# Altium footprint library CONN_FPC.PcbLib: 28 footprints (part 1 of 2)
Each footprint in its own frame and in the unit in brackets; x right, y up, seen from the top. Pads: shape width x height; smd on the part's side, far side on the other; paste and mask are expansions set on the pad; w line width, h text height; cw(c..) or ccw(c..) is an arc to the next point about the centre after c.
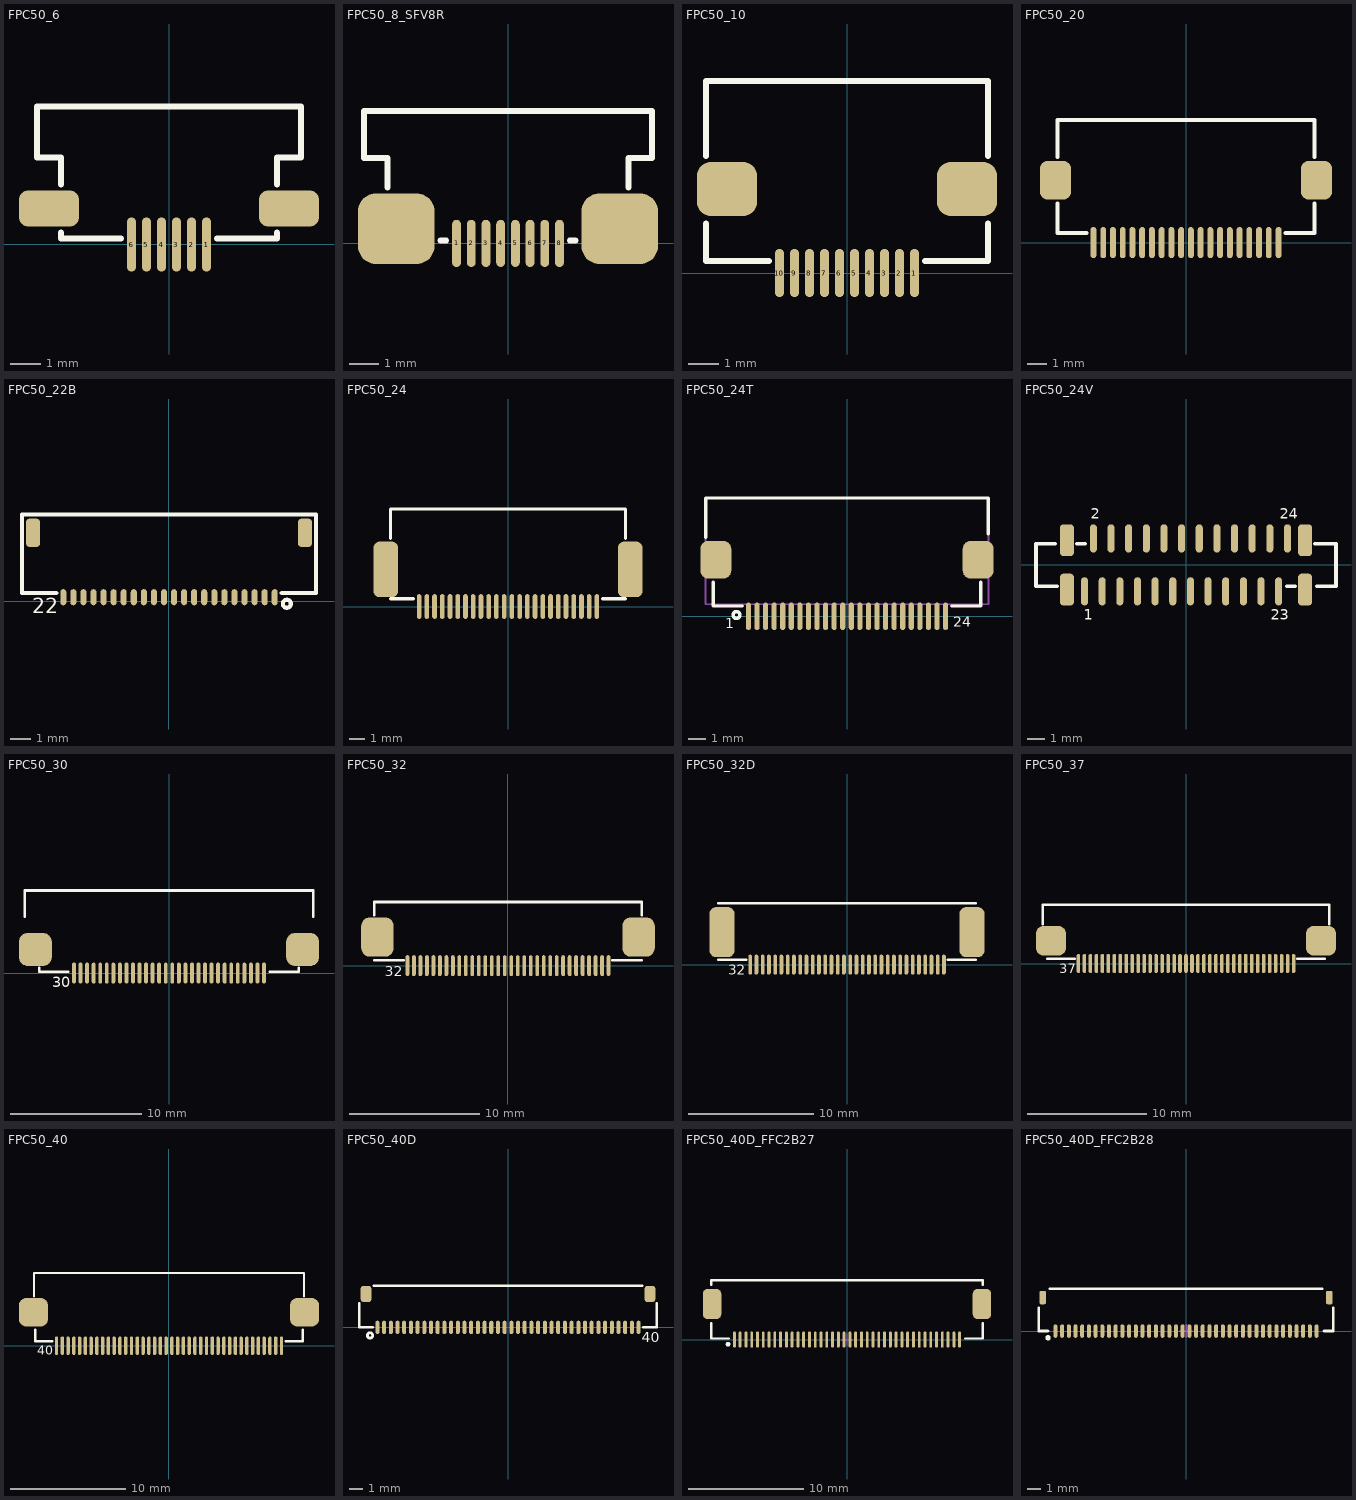
[diagram p0: the footprints below, top view; thin cyan lines are the x and y axes]

## FPC50_6 [mm] "FFC-FPC 6pin pitch: 0.5mm FCI SFV6R1STBE1HLF"
height 3
pads (8):
  oval 0.3x1.8 smd mask+0.075: 1(1.25,0) 2(0.75,0) 3(0.25,0) 4(-0.25,0) 5(-0.75,0) 6(-1.25,0)
  rrect50% 2x1.2 smd: ""(-4,1.2) ""(4,1.2)
Top Overlay:
  lines w0.2: -3.6,0.4 -3.6,0.2 -1.6,0.2 ; -3.6,2 -3.6,2.9 -4.4,2.9 -4.4,4.6 4.4,4.6 4.4,2.9 3.6,2.9 3.6,2 ; 1.6,0.2 3.6,0.2 3.6,0.4
3D body "sfv6r1stbe1hlf.stp": height 1.9, standoff 0.03, extent -4.25,-0.4 4.25,4.5

## FPC50_8_SFV8R [mm] "FPC 8pin pitch: 0.5mm FCI SFV8R-2STE1HLF"
pads (10):
  oval 0.3x1.6 smd mask+0.05: 1(-1.75,0) 2(-1.25,0) 3(-0.75,0) 4(-0.25,0) 5(0.25,0) 6(0.75,0) 7(1.25,0) 8(1.75,0)
  rrect50% 2.6x2.4 smd: ""(-3.8,0.5) ""(3.8,0.5)
Top Overlay:
  lines w0.2: -4.1,1.9 -4.1,2.9 -4.9,2.9 -4.9,4.5 4.9,4.5 4.9,2.9 4.1,2.9 4.1,1.9 ; -2.3,0.1 -2.1,0.1 ; 2.1,0.1 2.3,0.1
3D body "ssfv8r_2stlf.stp": height 1.82, standoff -0.05, extent -4.75,-0.5 4.75,4.4

## FPC50_10 [mm] "FPC, 0.50mm, SMT,RA Bot. Contact, WE 687110149022"
height 7.62
pads (12):
  oval 0.3x1.6 smd mask+0.05: 1(2.25,0) 2(1.75,0) 3(1.25,0) 4(0.75,0) 5(0.25,0) 6(-0.25,0) 7(-0.75,0) 8(-1.25,0) 9(-1.75,0) 10(-2.25,0)
  rrect50% 2x1.8 smd: ""(-4,2.8) ""(4,2.8)
Top Overlay:
  lines w0.2: -4.7,1.65 -4.7,0.4 -2.6,0.4 ; -4.7,3.9 -4.7,6.4 4.7,6.4 4.7,3.9 ; 2.6,0.4 4.7,0.4 4.7,1.65
3D body "687110149022.stp": height 2.25, standoff 0, extent -4.55,-0.225 4.55,6.275

## FPC50_20 [mm] "FH12-20S-0.5SH FFC-FPC pitch: 0.5mm"
height 3
pads (22):
  oval 0.3x1.6 smd mask+0.05: 1(4.75,0) 2(4.25,0) 3(3.75,0) 4(3.25,0) 5(2.75,0) 6(2.25,0) 7(1.75,0) 8(1.25,0) 9(0.75,0) 10(0.25,0) 11(-0.25,0) 12(-0.75,0) 13(-1.25,0) 14(-1.75,0) 15(-2.25,0) 16(-2.75,0) 17(-3.25,0) 18(-3.75,0) 19(-4.25,0) 20(-4.75,0)
  rrect50% 1.6x2 smd: ""(-6.7,3.2) ""(6.7,3.2)
Top Overlay:
  lines w0.2: -6.6,2 -6.6,0.5 -5.1,0.5 ; -6.6,4.4 -6.6,6.3 6.6,6.3 6.6,4.4 ; 5.1,0.5 6.6,0.5 6.6,2
3D body "FH12-20S-0.5SH.stp": height 2.14, standoff 0.04, extent -7.05,-0.2 7.05,6.2

## FPC50_22B [mm] "Connector; FH12 Series; 24 Position; 0.5mm, Top Contact, FH12A-24S-0.5SH(55)"
height 2
pads (24):
  oval 0.3x0.8 smd mask+0.05: 1(5.25,0.2) 2(4.75,0.2) 3(4.25,0.2) 4(3.75,0.2) 5(3.25,0.2) 6(2.75,0.2) 7(2.25,0.2) 8(1.75,0.2) 9(1.25,0.2) 10(0.75,0.2) 11(0.25,0.2) 12(-0.25,0.2) 13(-0.75,0.2) 14(-1.25,0.2) 15(-1.75,0.2) 16(-2.25,0.2) 17(-2.75,0.2) 18(-3.25,0.2) 19(-3.75,0.2) 20(-4.25,0.2) 21(-4.75,0.2) 22(-5.25,0.2)
  rrect50% 0.7x1.4 smd: ""(-6.75,3.4) ""(6.75,3.4)
Top Overlay:
  circle w0.2: c5.85,-0.125 r0.2
  lines w0.2: -5.6,0.4 -7.3,0.4 -7.3,4.3 7.3,4.3 7.3,0.4 5.6,0.4
  text "22" at -6.8,-0.6 h0.75
3D body "FH55-22S-0.5SH.stp": height 1.46, standoff -0.04, extent -7.2,0 7.2,4.25

## FPC50_24 [mm] "FPC, FH12 Series; 24 Position; 0.5mm, Bottom Contact, FH12F-24S-0.5SH"
pads (26):
  oval 0.3x1.6 smd mask+0.05: 1(5.75,0) 2(5.25,0) 3(4.75,0) 4(4.25,0) 5(3.75,0) 6(3.25,0) 7(2.75,0) 8(2.25,0) 9(1.75,0) 10(1.25,0) 11(0.75,0) 12(0.25,0) 13(-0.25,0) 14(-0.75,0) 15(-1.25,0) 16(-1.75,0) 17(-2.25,0) 18(-2.75,0) 19(-3.25,0) 20(-3.75,0) 21(-4.25,0) 22(-4.75,0) 23(-5.25,0) 24(-5.75,0)
  rrect50% 1.6x3.6 smd: ""(-7.9,2.4) ""(7.9,2.4)
Top Overlay:
  lines w0.2: -7.6,0.5 -6.1,0.5 ; -7.6,4.4 -7.6,6.3 7.6,6.3 7.6,4.4 ; 6.1,0.5 7.6,0.5
3D body "FH12F-24S-0.5SH.stp": height 2.04, standoff -0.06, extent -8.05,-0.2 8.05,6.2

## FPC50_24T [mm] "Connector; FH12 Series; 24 Position; 0.5mm, Top Contact, FH12A-24S-0.5SH(55)"
height 2
pads (26):
  oval 0.3x1.6 smd mask+0.05: 1(-5.75,0) 2(-5.25,0) 3(-4.75,0) 4(-4.25,0) 5(-3.75,0) 6(-3.25,0) 7(-2.75,0) 8(-2.25,0) 9(-1.75,0) 10(-1.25,0) 11(-0.75,0) 12(-0.25,0) 13(0.25,0) 14(0.75,0) 15(1.25,0) 16(1.75,0) 17(2.25,0) 18(2.75,0) 19(3.25,0) 20(3.75,0) 21(4.25,0) 22(4.75,0) 23(5.25,0) 24(5.75,0)
  rrect50% 1.8x2.2 smd: ""(-7.65,3.3) ""(7.65,3.3)
Top Overlay:
  circle w0.2: c-6.45,0.075 r0.2
  lines w0.2: -8.25,4.6 -8.25,6.9 8.25,6.9 8.25,4.825 ; -7.8,2 -7.8,0.6 -6.1,0.6 ; 6.1,0.6 7.8,0.6 7.8,2
  text "24" at 6.2,-0.6 h0.6
  text "1" at -7.1,-0.7 h0.6
Mechanical 13:
  lines w0.1: -8.25,0.7 -8.25,6.9 8.25,6.9 8.25,0.7 -8.25,0.7
3D body "FH12A-24S-0.5SH.stp": height 2.05, standoff -0.1, extent -8.25,-0.2 8.25,6.8

## FPC50_24V [mm] "Connector; FH12 Series; 24 Position; 0.5mm, Vertical, FH12-24S-0.5SV"
height 4.85
pads (28):
  oval 0.4x1.6 smd: 1(-5.75,-1.5) 2(-5.25,1.5) 3(-4.75,-1.5) 4(-4.25,1.5) 5(-3.75,-1.5) 6(-3.25,1.5) 7(-2.75,-1.5) 8(-2.25,1.5) 9(-1.75,-1.5) 10(-1.25,1.5) 11(-0.75,-1.5) 12(-0.25,1.5) 13(0.25,-1.5) 14(0.75,1.5) 15(1.25,-1.5) 16(1.75,1.5) 17(2.25,-1.5) 18(2.75,1.5) 19(3.25,-1.5) 20(3.75,1.5) 21(4.25,-1.5) 22(4.75,1.5) 23(5.25,-1.5) 24(5.75,1.5)
  rrect50% 0.8x1.8 smd: ""(-6.75,-1.4) ""(-6.75,1.4) ""(6.75,-1.4) ""(6.75,1.4)
Top Overlay:
  lines w0.2: -7.4,1.2 -8.5,1.2 -8.5,-1.2 -7.3,-1.2 ; -6.2,1.2 -5.7,1.2 ; 5.7,-1.2 6.2,-1.2 ; 7.3,1.2 8.5,1.2 8.5,-1.2 7.4,-1.2
  text "23" at 4.8,-3.1 h0.6
  text "24" at 5.3,2.6 h0.6
  text "2" at -5.4,2.6 h0.6
  text "1" at -5.8,-3.1 h0.6
3D body "FH12-24S-0.5SV.stp": height 5.48, standoff -0.03, extent -7.7,-1.8 7.7,2

## FPC50_30 [mm] "FPC, pitch: 0.5mm, FPC0.5MM4.6H30P-H"
height 3
pads (33):
  oval 0.3x1.6 smd mask+0.05: 1(7.25,0) 2(6.75,0) 3(6.25,0) 4(5.75,0) 5(5.25,0) 6(4.75,0) 7(4.25,0) 8(3.75,0) 9(3.25,0) 10(2.75,0) 11(2.25,0) 12(1.75,0) 13(1.25,0) 14(0.75,0) 15(0.25,0) 16(-0.25,0) 17(-0.75,0) 18(-1.25,0) 19(-1.75,0) 20(-2.25,0) 21(-2.75,0) 22(-3.25,0) 23(-3.75,0) 24(-4.25,0) 25(-4.75,0) 26(-5.25,0) 27(-5.75,0) 28(-6.25,0) 29(-6.75,0) 30(-7.25,0)
  rrect50% 2.5x2.5 smd: ""(-10.2,1.8) ""(-10.2,1.8) ""(10.2,1.8)
Top Overlay:
  lines w0.2: -11,4.3 -11,6.3 11,6.3 11,4.3 ; -9.9,0.4 -9.9,0.1 -7.7,0.1 ; 7.7,0.1 9.9,0.1 9.9,0.4
  text "30" at -8.9,-1.1 h0.8
3D body "FPC0_5MM4_6H30P-H.step": height 2.1, standoff 0.05, extent -10.8,-0.5 10.8,6.1

## FPC50_32 [mm] "FPC, FH12 Series; 32 Position; 0.5mm, Bottom Contact,"
height 3
pads (34):
  oval 0.3x1.6 smd mask+0.05: 1(7.75,0) 2(7.25,0) 3(6.75,0) 4(6.25,0) 5(5.75,0) 6(5.25,0) 7(4.75,0) 8(4.25,0) 9(3.75,0) 10(3.25,0) 11(2.75,0) 12(2.25,0) 13(1.75,0) 14(1.25,0) 15(0.75,0) 16(0.25,0) 17(-0.25,0) 18(-0.75,0) 19(-1.25,0) 20(-1.75,0) 21(-2.25,0) 22(-2.75,0) 23(-3.25,0) 24(-3.75,0) 25(-4.25,0) 26(-4.75,0) 27(-5.25,0) 28(-5.75,0) 29(-6.25,0) 30(-6.75,0) 31(-7.25,0) 32(-7.75,0)
  rrect50% 2.5x3 smd: ""(-10.05,2.2) ""(10.05,2.2)
Top Overlay:
  lines w0.2: -10.3,0.4 -8.05,0.4 ; -10.3,3.9 -10.3,4.9 10.3,4.9 10.3,3.9 ; 8.05,0.4 10.3,0.4
  text "32" at -9.5,-0.8 h0.8
3D body "FFC2B35-32-T.stp": height 1.99, standoff -0.01, extent -10.2,-0.3 10.2,6.46

## FPC50_32D [mm] "FPC, 32 Position; 0.5mm, Dual Side Contact,"
height 3
pads (34):
  oval 0.3x1.6 smd mask+0.05: 1(7.75,0) 2(7.25,0) 3(6.75,0) 4(6.25,0) 5(5.75,0) 6(5.25,0) 7(4.75,0) 8(4.25,0) 9(3.75,0) 10(3.25,0) 11(2.75,0) 12(2.25,0) 13(1.75,0) 14(1.25,0) 15(0.75,0) 16(0.25,0) 17(-0.25,0) 18(-0.75,0) 19(-1.25,0) 20(-1.75,0) 21(-2.25,0) 22(-2.75,0) 23(-3.25,0) 24(-3.75,0) 25(-4.25,0) 26(-4.75,0) 27(-5.25,0) 28(-5.75,0) 29(-6.25,0) 30(-6.75,0) 31(-7.25,0) 32(-7.75,0)
  rrect50% 2x4 smd: ""(-10,2.6) ""(10,2.6)
Top Overlay:
  lines w0.2: -10.3,0.4 -8.05,0.4 ; -10.3,4.9 10.3,4.9 ; 8.05,0.4 10.3,0.4
  text "32" at -9.5,-0.8 h0.8
3D body "XF2M_3215_1A.step": height 2, standoff 0, extent -10.05,-1.035 10.05,4.865

## FPC50_37 [mm] "FPC, pitch: 0.5mm, TE 3-1734592-7"
height 3
pads (39):
  oval 0.3x1.6 smd mask+0.05: 1(9,0) 2(8.5,0) 3(8,0) 4(7.5,0) 5(7,0) 6(6.5,0) 7(6,0) 8(5.5,0) 9(5,0) 10(4.5,0) 11(4,0) 12(3.5,0) 13(3,0) 14(2.5,0) 15(2,0) 16(1.5,0) 17(1,0) 18(0.5,0) 19(0,0) 20(-0.5,0) 21(-1,0) 22(-1.5,0) 23(-2,0) 24(-2.5,0) 25(-3,0) 26(-3.5,0) 27(-4,0) 28(-4.5,0) 29(-5,0) 30(-5.5,0) 31(-6,0) 32(-6.5,0) 33(-7,0) 34(-7.5,0) 35(-8,0) 36(-8.5,0) 37(-9,0)
  rrect50% 2.5x2.5 smd: ""(-11.3,1.9) ""(11.3,1.9)
Top Overlay:
  lines w0.2: -12,3.3 -12,4.9 12,4.9 12,3.3 ; -11.6,0.4 -9.3,0.4 ; 9.3,0.4 11.6,0.4
  text "37" at -10.6,-0.8 h0.8
3D body "3-1734592-7.stp": height 2.05, standoff 0, extent -11.965,-0.3 11.965,4.81

## FPC50_40 [mm] "FPC, pitch: 0.5mm, FH12-40S-0.5SH, molex 54132-4062"
height 3
pads (42):
  oval 0.3x1.6 smd mask+0.05: 1(9.75,0) 2(9.25,0) 3(8.75,0) 4(8.25,0) 5(7.75,0) 6(7.25,0) 7(6.75,0) 8(6.25,0) 9(5.75,0) 10(5.25,0) 11(4.75,0) 12(4.25,0) 13(3.75,0) 14(3.25,0) 15(2.75,0) 16(2.25,0) 17(1.75,0) 18(1.25,0) 19(0.75,0) 20(0.25,0) 21(-0.25,0) 22(-0.75,0) 23(-1.25,0) 24(-1.75,0) 25(-2.25,0) 26(-2.75,0) 27(-3.25,0) 28(-3.75,0) 29(-4.25,0) 30(-4.75,0) 31(-5.25,0) 32(-5.75,0) 33(-6.25,0) 34(-6.75,0) 35(-7.25,0) 36(-7.75,0) 37(-8.25,0) 38(-8.75,0) 39(-9.25,0) 40(-9.75,0)
  rrect50% 2.5x2.5 smd: ""(-11.75,2.9) ""(11.75,2.9)
Top Overlay:
  lines w0.2: -11.7,4.3 -11.7,6.3 11.7,6.3 11.7,4.3 ; -11.6,1.4 -11.6,0.4 -10.1,0.4 ; 10.1,0.4 11.6,0.4 11.6,1.4
  text "40" at -11.4,-0.8 h0.8
3D body "FH12-40S-0.5SH.stp": height 2.09, standoff -0.01, extent -12.05,-0.3 12.05,6.1

## FPC50_40D [mm] "FPC, 40 Position; 0.5mm, Top&Bottom Contact, FH34SRJ-40S-0.5SH"
height 2
pads (42):
  oval 0.3x1 smd paste-0.025 mask+0.05: 1(-9.75,0) 2(-9.25,0) 3(-8.75,0) 4(-8.25,0) 5(-7.75,0) 6(-7.25,0) 7(-6.75,0) 8(-6.25,0) 9(-5.75,0) 10(-5.25,0) 11(-4.75,0) 12(-4.25,0) 13(-3.75,0) 14(-3.25,0) 15(-2.75,0) 16(-2.25,0) 17(-1.75,0) 18(-1.25,0) 19(-0.75,0) 20(-0.25,0) 21(0.25,0) 22(0.75,0) 23(1.25,0) 24(1.75,0) 25(2.25,0) 26(2.75,0) 27(3.25,0) 28(3.75,0) 29(4.25,0) 30(4.75,0) 31(5.25,0) 32(5.75,0) 33(6.25,0) 34(6.75,0) 35(7.25,0) 36(7.75,0) 37(8.25,0) 38(8.75,0) 39(9.25,0) 40(9.75,0)
  rrect50% 0.8x1.2 smd paste-0.05 mask+0.05: ""(-10.6,2.5) ""(10.6,2.5)
Top Overlay:
  circle w0.2: c-10.3,-0.6 r0.2
  lines w0.2: -11.1,1.8 -11.1,0 -10.1,0 ; -10,3.1 10,3.1 ; 10.1,0 11.1,0 11.1,1.8
  text "40" at 10,-1.1 h0.75
3D body "FH34SRJ-40S-0.5SH.stp": height 1, standoff 0, extent -11,-0.8 11,3

## FPC50_40D_FFC2B27 [mm] "FPC, 40 Position; 0.5mm, Top&Bottom Contact, GCT FFC2B27-40-G"
pads (42):
  oval 0.25x1.4 smd mask+0.05: 1(-9.75,0) 2(-9.25,0) 3(-8.75,0) 4(-8.25,0) 5(-7.75,0) 6(-7.25,0) 7(-6.75,0) 8(-6.25,0) 9(-5.75,0) 10(-5.25,0) 11(-4.75,0) 12(-4.25,0) 13(-3.75,0) 14(-3.25,0) 15(-2.75,0) 16(-2.25,0) 17(-1.75,0) 18(-1.25,0) 19(-0.75,0) 20(-0.25,0) 21(0.25,0) 22(0.75,0) 23(1.25,0) 24(1.75,0) 25(2.25,0) 26(2.75,0) 27(3.25,0) 28(3.75,0) 29(4.25,0) 30(4.75,0) 31(5.25,0) 32(5.75,0) 33(6.25,0) 34(6.75,0) 35(7.25,0) 36(7.75,0) 37(8.25,0) 38(8.75,0) 39(9.25,0) 40(9.75,0)
  rrect50% 1.6x2.6 smd: ""(-11.685,3.08) ""(11.685,3.08)
Top Overlay:
  circle w0.2: c-10.3,-0.4 r0.1
  lines w0.2: -11.75,1.418 -11.75,0.09 -10.225,0.09 ; -11.75,4.718 -11.75,5.13 11.75,5.13 11.75,4.718 ; 10.225,0.09 11.75,0.09 11.75,1.418
Mechanical 13:
  lines w0.1: -0.5,0 0.5,0 ; 0,-0.5 0,0.5
3D body "FFC2B27-40-G.stp": height 2.87, standoff -0.05, extent -11.75,-0.2 11.75,5.07

## FPC50_40D_FFC2B28 [mm] "FPC, 40 Position; 0.5mm, Top&Bottom Contact, GCT FFC2B28-40-G"
height 1.75
pads (42):
  oval 0.3x1 smd mask+0.05: 1(-9.75,0) 2(-9.25,0) 3(-8.75,0) 4(-8.25,0) 5(-7.75,0) 6(-7.25,0) 7(-6.75,0) 8(-6.25,0) 9(-5.75,0) 10(-5.25,0) 11(-4.75,0) 12(-4.25,0) 13(-3.75,0) 14(-3.25,0) 15(-2.75,0) 16(-2.25,0) 17(-1.75,0) 18(-1.25,0) 19(-0.75,0) 20(-0.25,0) 21(0.25,0) 22(0.75,0) 23(1.25,0) 24(1.75,0) 25(2.25,0) 26(2.75,0) 27(3.25,0) 28(3.75,0) 29(4.25,0) 30(4.75,0) 31(5.25,0) 32(5.75,0) 33(6.25,0) 34(6.75,0) 35(7.25,0) 36(7.75,0) 37(8.25,0) 38(8.75,0) 39(9.25,0) 40(9.75,0)
  rrect50% 0.5x1 smd: ""(-10.7,2.5) ""(10.7,2.5)
Top Overlay:
  circle w0.2: c-10.3,-0.5 r0.1
  lines w0.2: -11,1.75 -11,0 -10.3,0 ; -10.15,3.15 10.15,3.15 ; 10.3,0 11,0 11,1.75
Mechanical 13:
  lines w0.1: -0.5,0 0.5,0 ; 0,-0.5 0,0.5
3D body "FFC2B28-40-G.stp": height 1.72, standoff -0.03, extent -11,-0.25 11,3